# Altium footprint library con-samtec.PCBLIB: 805 footprints (part 54 of 55)
Each footprint in its own frame and in the unit in brackets; x right, y up, seen from the top. Pads: shape width x height; smd on the part's side, far side on the other; paste and mask are expansions set on the pad; w line width, h text height; cw(c..) or ccw(c..) is an arc to the next point about the centre after c.
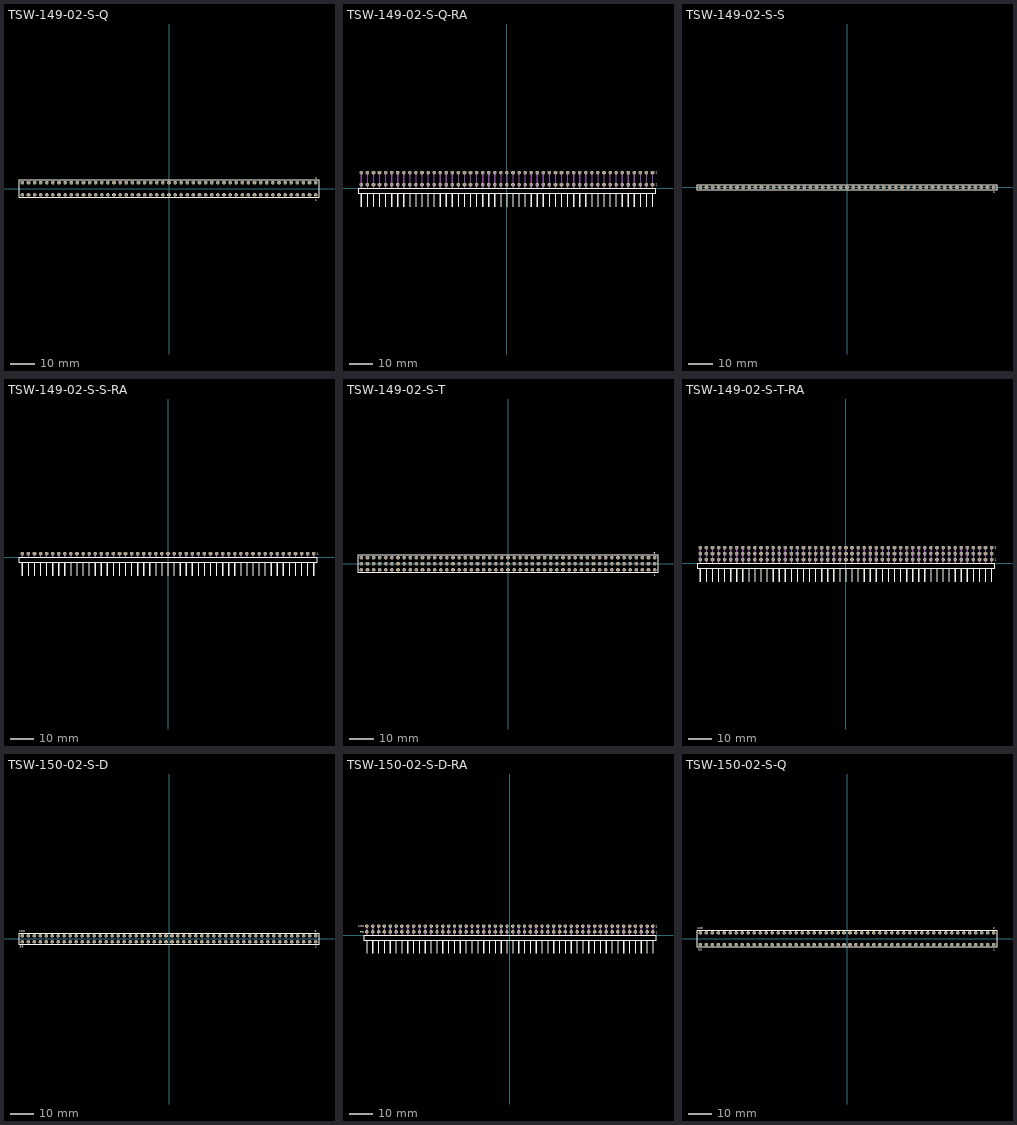
[diagram p53: the footprints below, top view; thin cyan lines are the x and y axes]

## TSW-149-02-S-Q [mm]
pads (98):
  oct 1.5x1.5 hole 1: 1(60.96,-2.54) 2(60.96,2.54) 3(58.42,-2.54) 4(58.42,2.54) 5(55.88,-2.54) 6(55.88,2.54) 7(53.34,-2.54) 8(53.34,2.54) 9(50.8,-2.54) 10(50.8,2.54) 11(48.26,-2.54) 12(48.26,2.54) 13(45.72,-2.54) 14(45.72,2.54) 15(43.18,-2.54) 16(43.18,2.54) 17(40.64,-2.54) 18(40.64,2.54) 19(38.1,-2.54) 20(38.1,2.54) 21(35.56,-2.54) 22(35.56,2.54) 23(33.02,-2.54) 24(33.02,2.54) 25(30.48,-2.54) 26(30.48,2.54) 27(27.94,-2.54) 28(27.94,2.54) 29(25.4,-2.54) 30(25.4,2.54) 31(22.86,-2.54) 32(22.86,2.54) 33(20.32,-2.54) 34(20.32,2.54) 35(17.78,-2.54) 36(17.78,2.54) 37(15.24,-2.54) 38(15.24,2.54) 39(12.7,-2.54) 40(12.7,2.54) 41(10.16,-2.54) 42(10.16,2.54) 43(7.62,-2.54) 44(7.62,2.54) 45(5.08,-2.54) 46(5.08,2.54) 47(2.54,-2.54) 48(2.54,2.54) 49(0,-2.54) 50(0,2.54) 51(-2.54,-2.54) 52(-2.54,2.54) 53(-5.08,-2.54) 54(-5.08,2.54) 55(-7.62,-2.54) 56(-7.62,2.54) 57(-10.16,-2.54) 58(-10.16,2.54) 59(-12.7,-2.54) 60(-12.7,2.54) 61(-15.24,-2.54) 62(-15.24,2.54) 63(-17.78,-2.54) 64(-17.78,2.54) 65(-20.32,-2.54) 66(-20.32,2.54) 67(-22.86,-2.54) 68(-22.86,2.54) 69(-25.4,-2.54) 70(-25.4,2.54) 71(-27.94,-2.54) 72(-27.94,2.54) 73(-30.48,-2.54) 74(-30.48,2.54) 75(-33.02,-2.54) 76(-33.02,2.54) 77(-35.56,-2.54) 78(-35.56,2.54) 79(-38.1,-2.54) 80(-38.1,2.54) 81(-40.64,-2.54) 82(-40.64,2.54) 83(-43.18,-2.54) 84(-43.18,2.54) 85(-45.72,-2.54) 86(-45.72,2.54) 87(-48.26,-2.54) 88(-48.26,2.54) 89(-50.8,-2.54) 90(-50.8,2.54) 91(-53.34,-2.54) 92(-53.34,2.54) 93(-55.88,-2.54) 94(-55.88,2.54) 95(-58.42,-2.54) 96(-58.42,2.54) 97(-60.96,-2.54) 98(-60.96,2.54)
Top Overlay:
  lines w0.203: -62.359,-3.695 62.359,-3.695 62.359,3.695 -62.359,3.695 -62.359,-3.695
  text "1" at 60.802,-5.138 h0.94
  text "2" at 60.702,3.989 h0.94
Mechanical 16:
  rectangle: -61.31,-2.89 -60.61,-2.19
  rectangle: -61.31,2.19 -60.61,2.89
  rectangle: -58.77,-2.89 -58.07,-2.19
  rectangle: -58.77,2.19 -58.07,2.89
  rectangle: -56.23,-2.89 -55.53,-2.19
  rectangle: -56.23,2.19 -55.53,2.89
  rectangle: -53.69,-2.89 -52.99,-2.19
  rectangle: -53.69,2.19 -52.99,2.89
  rectangle: -51.15,-2.89 -50.45,-2.19
  rectangle: -51.15,2.19 -50.45,2.89
  rectangle: -48.61,-2.89 -47.91,-2.19
  rectangle: -48.61,2.19 -47.91,2.89
  rectangle: -46.07,-2.89 -45.37,-2.19
  rectangle: -46.07,2.19 -45.37,2.89
  rectangle: -43.53,-2.89 -42.83,-2.19
  rectangle: -43.53,2.19 -42.83,2.89
  rectangle: -40.99,-2.89 -40.29,-2.19
  rectangle: -40.99,2.19 -40.29,2.89
  rectangle: -38.45,-2.89 -37.75,-2.19
  rectangle: -38.45,2.19 -37.75,2.89
  rectangle: -35.91,-2.89 -35.21,-2.19
  rectangle: -35.91,2.19 -35.21,2.89
  rectangle: -33.37,-2.89 -32.67,-2.19
  rectangle: -33.37,2.19 -32.67,2.89
  rectangle: -30.83,-2.89 -30.13,-2.19
  rectangle: -30.83,2.19 -30.13,2.89
  rectangle: -28.29,-2.89 -27.59,-2.19
  rectangle: -28.29,2.19 -27.59,2.89
  rectangle: -25.75,-2.89 -25.05,-2.19
  rectangle: -25.75,2.19 -25.05,2.89
  rectangle: -23.21,-2.89 -22.51,-2.19
  rectangle: -23.21,2.19 -22.51,2.89
  rectangle: -20.67,-2.89 -19.97,-2.19
  rectangle: -20.67,2.19 -19.97,2.89
  rectangle: -18.13,-2.89 -17.43,-2.19
  rectangle: -18.13,2.19 -17.43,2.89
  rectangle: -15.59,-2.89 -14.89,-2.19
  rectangle: -15.59,2.19 -14.89,2.89
  rectangle: -13.05,-2.89 -12.35,-2.19
  rectangle: -13.05,2.19 -12.35,2.89
  rectangle: -10.51,-2.89 -9.81,-2.19
  rectangle: -10.51,2.19 -9.81,2.89
  rectangle: -7.97,-2.89 -7.27,-2.19
  rectangle: -7.97,2.19 -7.27,2.89
  rectangle: -5.43,-2.89 -4.73,-2.19
  rectangle: -5.43,2.19 -4.73,2.89
  rectangle: -2.89,-2.89 -2.19,-2.19
  rectangle: -2.89,2.19 -2.19,2.89
  rectangle: -0.35,-2.89 0.35,-2.19
  rectangle: -0.35,2.19 0.35,2.89
  rectangle: 2.19,-2.89 2.89,-2.19
  rectangle: 2.19,2.19 2.89,2.89
  rectangle: 4.73,-2.89 5.43,-2.19
  rectangle: 4.73,2.19 5.43,2.89
  rectangle: 7.27,-2.89 7.97,-2.19
  rectangle: 7.27,2.19 7.97,2.89
  rectangle: 9.81,-2.89 10.51,-2.19
  rectangle: 9.81,2.19 10.51,2.89
  rectangle: 12.35,-2.89 13.05,-2.19
  rectangle: 12.35,2.19 13.05,2.89
  rectangle: 14.89,-2.89 15.59,-2.19
  rectangle: 14.89,2.19 15.59,2.89
  rectangle: 17.43,-2.89 18.13,-2.19
  rectangle: 17.43,2.19 18.13,2.89
  rectangle: 19.97,-2.89 20.67,-2.19
  rectangle: 19.97,2.19 20.67,2.89
  rectangle: 22.51,-2.89 23.21,-2.19
  rectangle: 22.51,2.19 23.21,2.89
  rectangle: 25.05,-2.89 25.75,-2.19
  rectangle: 25.05,2.19 25.75,2.89
  rectangle: 27.59,-2.89 28.29,-2.19
  rectangle: 27.59,2.19 28.29,2.89
  rectangle: 30.13,-2.89 30.83,-2.19
  rectangle: 30.13,2.19 30.83,2.89
  rectangle: 32.67,-2.89 33.37,-2.19
  rectangle: 32.67,2.19 33.37,2.89
  rectangle: 35.21,-2.89 35.91,-2.19
  rectangle: 35.21,2.19 35.91,2.89
  rectangle: 37.75,-2.89 38.45,-2.19
  rectangle: 37.75,2.19 38.45,2.89
  rectangle: 40.29,-2.89 40.99,-2.19
  rectangle: 40.29,2.19 40.99,2.89
  rectangle: 42.83,-2.89 43.53,-2.19
  rectangle: 42.83,2.19 43.53,2.89
  rectangle: 45.37,-2.89 46.07,-2.19
  rectangle: 45.37,2.19 46.07,2.89
  rectangle: 47.91,-2.89 48.61,-2.19
  rectangle: 47.91,2.19 48.61,2.89
  rectangle: 50.45,-2.89 51.15,-2.19
  rectangle: 50.45,2.19 51.15,2.89
  rectangle: 52.99,-2.89 53.69,-2.19
  rectangle: 52.99,2.19 53.69,2.89
  rectangle: 55.53,-2.89 56.23,-2.19
  rectangle: 55.53,2.19 56.23,2.89
  rectangle: 58.07,-2.89 58.77,-2.19
  rectangle: 58.07,2.19 58.77,2.89
  rectangle: 60.61,-2.89 61.31,-2.19
  rectangle: 60.61,2.19 61.31,2.89

## TSW-149-02-S-Q-RA [mil]
pads (98):
  oct 59.06x59.06 hole 39.37: 1(2400,60) 2(2400,260) 3(2300,60) 4(2300,260) 5(2200,60) 6(2200,260) 7(2100,60) 8(2100,260) 9(2000,60) 10(2000,260) 11(1900,60) 12(1900,260) 13(1800,60) 14(1800,260) 15(1700,60) 16(1700,260) 17(1600,60) 18(1600,260) 19(1500,60) 20(1500,260) 21(1400,60) 22(1400,260) 23(1300,60) 24(1300,260) 25(1200,60) 26(1200,260) 27(1100,60) 28(1100,260) 29(1000,60) 30(1000,260) 31(900,60) 32(900,260) 33(800,60) 34(800,260) 35(700,60) 36(700,260) 37(600,60) 38(600,260) 39(500,60) 40(500,260) 41(400,60) 42(400,260) 43(300,60) 44(300,260) 45(200,60) 46(200,260) 47(100,60) 48(100,260) 49(0,60) 50(0,260) 51(-100,60) 52(-100,260) 53(-200,60) 54(-200,260) 55(-300,60) 56(-300,260) 57(-400,60) 58(-400,260) 59(-500,60) 60(-500,260) 61(-600,60) 62(-600,260) 63(-700,60) 64(-700,260) 65(-800,60) 66(-800,260) 67(-900,60) 68(-900,260) 69(-1000,60) 70(-1000,260) 71(-1100,60) 72(-1100,260) 73(-1200,60) 74(-1200,260) 75(-1300,60) 76(-1300,260) 77(-1400,60) 78(-1400,260) 79(-1500,60) 80(-1500,260) 81(-1600,60) 82(-1600,260) 83(-1700,60) 84(-1700,260) 85(-1800,60) 86(-1800,260) 87(-1900,60) 88(-1900,260) 89(-2000,60) 90(-2000,260) 91(-2100,60) 92(-2100,260) 93(-2200,60) 94(-2200,260) 95(-2300,60) 96(-2300,260) 97(-2400,60) 98(-2400,260)
Top Overlay:
  rectangle: -2410,-310.63 -2390,-80.32
  rectangle: -2310,-310.63 -2290,-80.32
  rectangle: -2210,-310.63 -2190,-80.32
  rectangle: -2110,-310.63 -2090,-80.32
  rectangle: -2010,-310.63 -1990,-80.32
  rectangle: -1910,-310.63 -1890,-80.32
  rectangle: -1810,-310.63 -1790,-80.32
  rectangle: -1710,-310.63 -1690,-80.32
  rectangle: -1610,-310.63 -1590,-80.32
  rectangle: -1510,-310.63 -1490,-80.32
  rectangle: -1410,-310.63 -1390,-80.32
  rectangle: -1310,-310.63 -1290,-80.32
  rectangle: -1210,-310.63 -1190,-80.32
  rectangle: -1110,-310.63 -1090,-80.32
  rectangle: -1010,-310.63 -990,-80.32
  rectangle: -910,-310.63 -890,-80.32
  rectangle: -810,-310.63 -790,-80.32
  rectangle: -710,-310.63 -690,-80.32
  rectangle: -610,-310.63 -590,-80.32
  rectangle: -510,-310.63 -490,-80.32
  rectangle: -410,-310.63 -390,-80.32
  rectangle: -310,-310.63 -290,-80.32
  rectangle: -210,-310.63 -190,-80.32
  rectangle: -110,-310.63 -90,-80.32
  rectangle: -10,-310.63 10,-80.32
  rectangle: 90,-310.63 110,-80.32
  rectangle: 190,-310.63 210,-80.32
  rectangle: 290,-310.63 310,-80.32
  rectangle: 390,-310.63 410,-80.32
  rectangle: 490,-310.63 510,-80.32
  rectangle: 590,-310.63 610,-80.32
  rectangle: 690,-310.63 710,-80.32
  rectangle: 790,-310.63 810,-80.32
  rectangle: 890,-310.63 910,-80.32
  rectangle: 990,-310.63 1010,-80.32
  rectangle: 1090,-310.63 1110,-80.32
  rectangle: 1190,-310.63 1210,-80.32
  rectangle: 1290,-310.63 1310,-80.32
  rectangle: 1390,-310.63 1410,-80.32
  rectangle: 1490,-310.63 1510,-80.32
  rectangle: 1590,-310.63 1610,-80.32
  rectangle: 1690,-310.63 1710,-80.32
  rectangle: 1790,-310.63 1810,-80.32
  rectangle: 1890,-310.63 1910,-80.32
  rectangle: 1990,-310.63 2010,-80.32
  rectangle: 2090,-310.63 2110,-80.32
  rectangle: 2190,-310.63 2210,-80.32
  rectangle: 2290,-310.63 2310,-80.32
  rectangle: 2390,-310.63 2410,-80.32
  lines w8: -2455.08,-80.55 2455.08,-80.55 2455.08,-4.17 -2455.08,-4.17 -2455.08,-80.55
  text "1" at 2453.54,43.31 h36.81
  text "2" at 2451.18,242.72 h36.81
Mechanical 16:
  rectangle: -2410,0 -2390,270
  rectangle: -2310,0 -2290,270
  rectangle: -2210,0 -2190,270
  rectangle: -2110,0 -2090,270
  rectangle: -2010,0 -1990,270
  rectangle: -1910,0 -1890,270
  rectangle: -1810,0 -1790,270
  rectangle: -1710,0 -1690,270
  rectangle: -1610,0 -1590,270
  rectangle: -1510,0 -1490,270
  rectangle: -1410,0 -1390,270
  rectangle: -1310,0 -1290,270
  rectangle: -1210,0 -1190,270
  rectangle: -1110,0 -1090,270
  rectangle: -1010,0 -990,270
  rectangle: -910,0 -890,270
  rectangle: -810,0 -790,270
  rectangle: -710,0 -690,270
  rectangle: -610,0 -590,270
  rectangle: -510,0 -490,270
  rectangle: -410,0 -390,270
  rectangle: -310,0 -290,270
  rectangle: -210,0 -190,270
  rectangle: -110,0 -90,270
  rectangle: -10,0 10,270
  rectangle: 90,0 110,270
  rectangle: 190,0 210,270
  rectangle: 290,0 310,270
  rectangle: 390,0 410,270
  rectangle: 490,0 510,270
  rectangle: 590,0 610,270
  rectangle: 690,0 710,270
  rectangle: 790,0 810,270
  rectangle: 890,0 910,270
  rectangle: 990,0 1010,270
  rectangle: 1090,0 1110,270
  rectangle: 1190,0 1210,270
  rectangle: 1290,0 1310,270
  rectangle: 1390,0 1410,270
  rectangle: 1490,0 1510,270
  rectangle: 1590,0 1610,270
  rectangle: 1690,0 1710,270
  rectangle: 1790,0 1810,270
  rectangle: 1890,0 1910,270
  rectangle: 1990,0 2010,270
  rectangle: 2090,0 2110,270
  rectangle: 2190,0 2210,270
  rectangle: 2290,0 2310,270
  rectangle: 2390,0 2410,270

## TSW-149-02-S-S [mm]
pads (49):
  oct 1.5x1.5 hole 1: 1(60.96,0) 2(58.42,0) 3(55.88,0) 4(53.34,0) 5(50.8,0) 6(48.26,0) 7(45.72,0) 8(43.18,0) 9(40.64,0) 10(38.1,0) 11(35.56,0) 12(33.02,0) 13(30.48,0) 14(27.94,0) 15(25.4,0) 16(22.86,0) 17(20.32,0) 18(17.78,0) 19(15.24,0) 20(12.7,0) 21(10.16,0) 22(7.62,0) 23(5.08,0) 24(2.54,0) 25(0,0) 26(-2.54,0) 27(-5.08,0) 28(-7.62,0) 29(-10.16,0) 30(-12.7,0) 31(-15.24,0) 32(-17.78,0) 33(-20.32,0) 34(-22.86,0) 35(-25.4,0) 36(-27.94,0) 37(-30.48,0) 38(-33.02,0) 39(-35.56,0) 40(-38.1,0) 41(-40.64,0) 42(-43.18,0) 43(-45.72,0) 44(-48.26,0) 45(-50.8,0) 46(-53.34,0) 47(-55.88,0) 48(-58.42,0) 49(-60.96,0)
Top Overlay:
  lines w0.203: -62.359,-1.155 62.359,-1.155 62.359,1.155 -62.359,1.155 -62.359,-1.155
  text "1" at 60.702,-2.498 h0.94
Mechanical 16:
  rectangle: -61.31,-0.35 -60.61,0.35
  rectangle: -58.77,-0.35 -58.07,0.35
  rectangle: -56.23,-0.35 -55.53,0.35
  rectangle: -53.69,-0.35 -52.99,0.35
  rectangle: -51.15,-0.35 -50.45,0.35
  rectangle: -48.61,-0.35 -47.91,0.35
  rectangle: -46.07,-0.35 -45.37,0.35
  rectangle: -43.53,-0.35 -42.83,0.35
  rectangle: -40.99,-0.35 -40.29,0.35
  rectangle: -38.45,-0.35 -37.75,0.35
  rectangle: -35.91,-0.35 -35.21,0.35
  rectangle: -33.37,-0.35 -32.67,0.35
  rectangle: -30.83,-0.35 -30.13,0.35
  rectangle: -28.29,-0.35 -27.59,0.35
  rectangle: -25.75,-0.35 -25.05,0.35
  rectangle: -23.21,-0.35 -22.51,0.35
  rectangle: -20.67,-0.35 -19.97,0.35
  rectangle: -18.13,-0.35 -17.43,0.35
  rectangle: -15.59,-0.35 -14.89,0.35
  rectangle: -13.05,-0.35 -12.35,0.35
  rectangle: -10.51,-0.35 -9.81,0.35
  rectangle: -7.97,-0.35 -7.27,0.35
  rectangle: -5.43,-0.35 -4.73,0.35
  rectangle: -2.89,-0.35 -2.19,0.35
  rectangle: -0.35,-0.35 0.35,0.35
  rectangle: 2.19,-0.35 2.89,0.35
  rectangle: 4.73,-0.35 5.43,0.35
  rectangle: 7.27,-0.35 7.97,0.35
  rectangle: 9.81,-0.35 10.51,0.35
  rectangle: 12.35,-0.35 13.05,0.35
  rectangle: 14.89,-0.35 15.59,0.35
  rectangle: 17.43,-0.35 18.13,0.35
  rectangle: 19.97,-0.35 20.67,0.35
  rectangle: 22.51,-0.35 23.21,0.35
  rectangle: 25.05,-0.35 25.75,0.35
  rectangle: 27.59,-0.35 28.29,0.35
  rectangle: 30.13,-0.35 30.83,0.35
  rectangle: 32.67,-0.35 33.37,0.35
  rectangle: 35.21,-0.35 35.91,0.35
  rectangle: 37.75,-0.35 38.45,0.35
  rectangle: 40.29,-0.35 40.99,0.35
  rectangle: 42.83,-0.35 43.53,0.35
  rectangle: 45.37,-0.35 46.07,0.35
  rectangle: 47.91,-0.35 48.61,0.35
  rectangle: 50.45,-0.35 51.15,0.35
  rectangle: 52.99,-0.35 53.69,0.35
  rectangle: 55.53,-0.35 56.23,0.35
  rectangle: 58.07,-0.35 58.77,0.35
  rectangle: 60.61,-0.35 61.31,0.35

## TSW-149-02-S-S-RA [mil]
pads (49):
  oct 59.06x59.06 hole 39.37: 1(2400,60) 2(2300,60) 3(2200,60) 4(2100,60) 5(2000,60) 6(1900,60) 7(1800,60) 8(1700,60) 9(1600,60) 10(1500,60) 11(1400,60) 12(1300,60) 13(1200,60) 14(1100,60) 15(1000,60) 16(900,60) 17(800,60) 18(700,60) 19(600,60) 20(500,60) 21(400,60) 22(300,60) 23(200,60) 24(100,60) 25(0,60) 26(-100,60) 27(-200,60) 28(-300,60) 29(-400,60) 30(-500,60) 31(-600,60) 32(-700,60) 33(-800,60) 34(-900,60) 35(-1000,60) 36(-1100,60) 37(-1200,60) 38(-1300,60) 39(-1400,60) 40(-1500,60) 41(-1600,60) 42(-1700,60) 43(-1800,60) 44(-1900,60) 45(-2000,60) 46(-2100,60) 47(-2200,60) 48(-2300,60) 49(-2400,60)
Top Overlay:
  rectangle: -2410,-310.63 -2390,-80.32
  rectangle: -2310,-310.63 -2290,-80.32
  rectangle: -2210,-310.63 -2190,-80.32
  rectangle: -2110,-310.63 -2090,-80.32
  rectangle: -2010,-310.63 -1990,-80.32
  rectangle: -1910,-310.63 -1890,-80.32
  rectangle: -1810,-310.63 -1790,-80.32
  rectangle: -1710,-310.63 -1690,-80.32
  rectangle: -1610,-310.63 -1590,-80.32
  rectangle: -1510,-310.63 -1490,-80.32
  rectangle: -1410,-310.63 -1390,-80.32
  rectangle: -1310,-310.63 -1290,-80.32
  rectangle: -1210,-310.63 -1190,-80.32
  rectangle: -1110,-310.63 -1090,-80.32
  rectangle: -1010,-310.63 -990,-80.32
  rectangle: -910,-310.63 -890,-80.32
  rectangle: -810,-310.63 -790,-80.32
  rectangle: -710,-310.63 -690,-80.32
  rectangle: -610,-310.63 -590,-80.32
  rectangle: -510,-310.63 -490,-80.32
  rectangle: -410,-310.63 -390,-80.32
  rectangle: -310,-310.63 -290,-80.32
  rectangle: -210,-310.63 -190,-80.32
  rectangle: -110,-310.63 -90,-80.32
  rectangle: -10,-310.63 10,-80.32
  rectangle: 90,-310.63 110,-80.32
  rectangle: 190,-310.63 210,-80.32
  rectangle: 290,-310.63 310,-80.32
  rectangle: 390,-310.63 410,-80.32
  rectangle: 490,-310.63 510,-80.32
  rectangle: 590,-310.63 610,-80.32
  rectangle: 690,-310.63 710,-80.32
  rectangle: 790,-310.63 810,-80.32
  rectangle: 890,-310.63 910,-80.32
  rectangle: 990,-310.63 1010,-80.32
  rectangle: 1090,-310.63 1110,-80.32
  rectangle: 1190,-310.63 1210,-80.32
  rectangle: 1290,-310.63 1310,-80.32
  rectangle: 1390,-310.63 1410,-80.32
  rectangle: 1490,-310.63 1510,-80.32
  rectangle: 1590,-310.63 1610,-80.32
  rectangle: 1690,-310.63 1710,-80.32
  rectangle: 1790,-310.63 1810,-80.32
  rectangle: 1890,-310.63 1910,-80.32
  rectangle: 1990,-310.63 2010,-80.32
  rectangle: 2090,-310.63 2110,-80.32
  rectangle: 2190,-310.63 2210,-80.32
  rectangle: 2290,-310.63 2310,-80.32
  rectangle: 2390,-310.63 2410,-80.32
  lines w8: -2455.08,-80.55 2455.08,-80.55 2455.08,-4.17 -2455.08,-4.17 -2455.08,-80.55
  text "1" at 2450.47,45.35 h36.81
Mechanical 16:
  rectangle: -2410,0 -2390,70
  rectangle: -2310,0 -2290,70
  rectangle: -2210,0 -2190,70
  rectangle: -2110,0 -2090,70
  rectangle: -2010,0 -1990,70
  rectangle: -1910,0 -1890,70
  rectangle: -1810,0 -1790,70
  rectangle: -1710,0 -1690,70
  rectangle: -1610,0 -1590,70
  rectangle: -1510,0 -1490,70
  rectangle: -1410,0 -1390,70
  rectangle: -1310,0 -1290,70
  rectangle: -1210,0 -1190,70
  rectangle: -1110,0 -1090,70
  rectangle: -1010,0 -990,70
  rectangle: -910,0 -890,70
  rectangle: -810,0 -790,70
  rectangle: -710,0 -690,70
  rectangle: -610,0 -590,70
  rectangle: -510,0 -490,70
  rectangle: -410,0 -390,70
  rectangle: -310,0 -290,70
  rectangle: -210,0 -190,70
  rectangle: -110,0 -90,70
  rectangle: -10,0 10,70
  rectangle: 90,0 110,70
  rectangle: 190,0 210,70
  rectangle: 290,0 310,70
  rectangle: 390,0 410,70
  rectangle: 490,0 510,70
  rectangle: 590,0 610,70
  rectangle: 690,0 710,70
  rectangle: 790,0 810,70
  rectangle: 890,0 910,70
  rectangle: 990,0 1010,70
  rectangle: 1090,0 1110,70
  rectangle: 1190,0 1210,70
  rectangle: 1290,0 1310,70
  rectangle: 1390,0 1410,70
  rectangle: 1490,0 1510,70
  rectangle: 1590,0 1610,70
  rectangle: 1690,0 1710,70
  rectangle: 1790,0 1810,70
  rectangle: 1890,0 1910,70
  rectangle: 1990,0 2010,70
  rectangle: 2090,0 2110,70
  rectangle: 2190,0 2210,70
  rectangle: 2290,0 2310,70
  rectangle: 2390,0 2410,70

## TSW-149-02-S-T [mm]
pads (147):
  oct 1.5x1.5 hole 1: 1(60.96,-2.54) 2(60.96,0) 3(60.96,2.54) 4(58.42,-2.54) 5(58.42,0) 6(58.42,2.54) 7(55.88,-2.54) 8(55.88,0) 9(55.88,2.54) 10(53.34,-2.54) 11(53.34,0) 12(53.34,2.54) 13(50.8,-2.54) 14(50.8,0) 15(50.8,2.54) 16(48.26,-2.54) 17(48.26,0) 18(48.26,2.54) 19(45.72,-2.54) 20(45.72,0) 21(45.72,2.54) 22(43.18,-2.54) 23(43.18,0) 24(43.18,2.54) 25(40.64,-2.54) 26(40.64,0) 27(40.64,2.54) 28(38.1,-2.54) 29(38.1,0) 30(38.1,2.54) 31(35.56,-2.54) 32(35.56,0) 33(35.56,2.54) 34(33.02,-2.54) 35(33.02,0) 36(33.02,2.54) 37(30.48,-2.54) 38(30.48,0) 39(30.48,2.54) 40(27.94,-2.54) 41(27.94,0) 42(27.94,2.54) 43(25.4,-2.54) 44(25.4,0) 45(25.4,2.54) 46(22.86,-2.54) 47(22.86,0) 48(22.86,2.54) 49(20.32,-2.54) 50(20.32,0) 51(20.32,2.54) 52(17.78,-2.54) 53(17.78,0) 54(17.78,2.54) 55(15.24,-2.54) 56(15.24,0) 57(15.24,2.54) 58(12.7,-2.54) 59(12.7,0) 60(12.7,2.54) 61(10.16,-2.54) 62(10.16,0) 63(10.16,2.54) 64(7.62,-2.54) 65(7.62,0) 66(7.62,2.54) 67(5.08,-2.54) 68(5.08,0) 69(5.08,2.54) 70(2.54,-2.54) 71(2.54,0) 72(2.54,2.54) 73(0,-2.54) 74(0,0) 75(0,2.54) 76(-2.54,-2.54) 77(-2.54,0) 78(-2.54,2.54) 79(-5.08,-2.54) 80(-5.08,0) 81(-5.08,2.54) 82(-7.62,-2.54) 83(-7.62,0) 84(-7.62,2.54) 85(-10.16,-2.54) 86(-10.16,0) 87(-10.16,2.54) 88(-12.7,-2.54) 89(-12.7,0) 90(-12.7,2.54) 91(-15.24,-2.54) 92(-15.24,0) 93(-15.24,2.54) 94(-17.78,-2.54) 95(-17.78,0) 96(-17.78,2.54) 97(-20.32,-2.54) 98(-20.32,0) 99(-20.32,2.54) 100(-22.86,-2.54) 101(-22.86,0) 102(-22.86,2.54) 103(-25.4,-2.54) 104(-25.4,0) 105(-25.4,2.54) 106(-27.94,-2.54) 107(-27.94,0) 108(-27.94,2.54) 109(-30.48,-2.54) 110(-30.48,0) 111(-30.48,2.54) 112(-33.02,-2.54) 113(-33.02,0) 114(-33.02,2.54) 115(-35.56,-2.54) 116(-35.56,0) 117(-35.56,2.54) 118(-38.1,-2.54) 119(-38.1,0) 120(-38.1,2.54) 121(-40.64,-2.54) 122(-40.64,0) 123(-40.64,2.54) 124(-43.18,-2.54) 125(-43.18,0) 126(-43.18,2.54) 127(-45.72,-2.54) 128(-45.72,0) 129(-45.72,2.54) 130(-48.26,-2.54) 131(-48.26,0) 132(-48.26,2.54) 133(-50.8,-2.54) 134(-50.8,0) 135(-50.8,2.54) 136(-53.34,-2.54) 137(-53.34,0) 138(-53.34,2.54) 139(-55.88,-2.54) 140(-55.88,0) 141(-55.88,2.54) 142(-58.42,-2.54) 143(-58.42,0) 144(-58.42,2.54) 145(-60.96,-2.54) 146(-60.96,0) 147(-60.96,2.54)
Top Overlay:
  lines w0.203: -62.359,-3.695 62.359,-3.695 62.359,3.695 -62.359,3.695 -62.359,-3.695
  text "1" at 60.652,-5.188 h0.94
  text "3" at 60.648,3.989 h0.94
Mechanical 16:
  rectangle: -61.31,-2.89 -60.61,-2.19
  rectangle: -61.31,-0.35 -60.61,0.35
  rectangle: -61.31,2.19 -60.61,2.89
  rectangle: -58.77,-2.89 -58.07,-2.19
  rectangle: -58.77,-0.35 -58.07,0.35
  rectangle: -58.77,2.19 -58.07,2.89
  rectangle: -56.23,-2.89 -55.53,-2.19
  rectangle: -56.23,-0.35 -55.53,0.35
  rectangle: -56.23,2.19 -55.53,2.89
  rectangle: -53.69,-2.89 -52.99,-2.19
  rectangle: -53.69,-0.35 -52.99,0.35
  rectangle: -53.69,2.19 -52.99,2.89
  rectangle: -51.15,-2.89 -50.45,-2.19
  rectangle: -51.15,-0.35 -50.45,0.35
  rectangle: -51.15,2.19 -50.45,2.89
  rectangle: -48.61,-2.89 -47.91,-2.19
  rectangle: -48.61,-0.35 -47.91,0.35
  rectangle: -48.61,2.19 -47.91,2.89
  rectangle: -46.07,-2.89 -45.37,-2.19
  rectangle: -46.07,-0.35 -45.37,0.35
  rectangle: -46.07,2.19 -45.37,2.89
  rectangle: -43.53,-2.89 -42.83,-2.19
  rectangle: -43.53,-0.35 -42.83,0.35
  rectangle: -43.53,2.19 -42.83,2.89
  rectangle: -40.99,-2.89 -40.29,-2.19
  rectangle: -40.99,-0.35 -40.29,0.35
  rectangle: -40.99,2.19 -40.29,2.89
  rectangle: -38.45,-2.89 -37.75,-2.19
  rectangle: -38.45,-0.35 -37.75,0.35
  rectangle: -38.45,2.19 -37.75,2.89
  rectangle: -35.91,-2.89 -35.21,-2.19
  rectangle: -35.91,-0.35 -35.21,0.35
  rectangle: -35.91,2.19 -35.21,2.89
  rectangle: -33.37,-2.89 -32.67,-2.19
  rectangle: -33.37,-0.35 -32.67,0.35
  rectangle: -33.37,2.19 -32.67,2.89
  rectangle: -30.83,-2.89 -30.13,-2.19
  rectangle: -30.83,-0.35 -30.13,0.35
  rectangle: -30.83,2.19 -30.13,2.89
  rectangle: -28.29,-2.89 -27.59,-2.19
  rectangle: -28.29,-0.35 -27.59,0.35
  rectangle: -28.29,2.19 -27.59,2.89
  rectangle: -25.75,-2.89 -25.05,-2.19
  rectangle: -25.75,-0.35 -25.05,0.35
  rectangle: -25.75,2.19 -25.05,2.89
  rectangle: -23.21,-2.89 -22.51,-2.19
  rectangle: -23.21,-0.35 -22.51,0.35
  rectangle: -23.21,2.19 -22.51,2.89
  rectangle: -20.67,-2.89 -19.97,-2.19
  rectangle: -20.67,-0.35 -19.97,0.35
  rectangle: -20.67,2.19 -19.97,2.89
  rectangle: -18.13,-2.89 -17.43,-2.19
  rectangle: -18.13,-0.35 -17.43,0.35
  rectangle: -18.13,2.19 -17.43,2.89
  rectangle: -15.59,-2.89 -14.89,-2.19
  rectangle: -15.59,-0.35 -14.89,0.35
  rectangle: -15.59,2.19 -14.89,2.89
  rectangle: -13.05,-2.89 -12.35,-2.19
  rectangle: -13.05,-0.35 -12.35,0.35
  rectangle: -13.05,2.19 -12.35,2.89
  rectangle: -10.51,-2.89 -9.81,-2.19
  rectangle: -10.51,-0.35 -9.81,0.35
  rectangle: -10.51,2.19 -9.81,2.89
  rectangle: -7.97,-2.89 -7.27,-2.19